# Altium footprint library Inductors SMD.PcbLib: 145 footprints (part 3 of 10)
Each footprint in its own frame and in the unit in brackets; x right, y up, seen from the top. Pads: shape width x height; smd on the part's side, far side on the other; paste and mask are expansions set on the pad; w line width, h text height; cw(c..) or ccw(c..) is an arc to the next point about the centre after c.
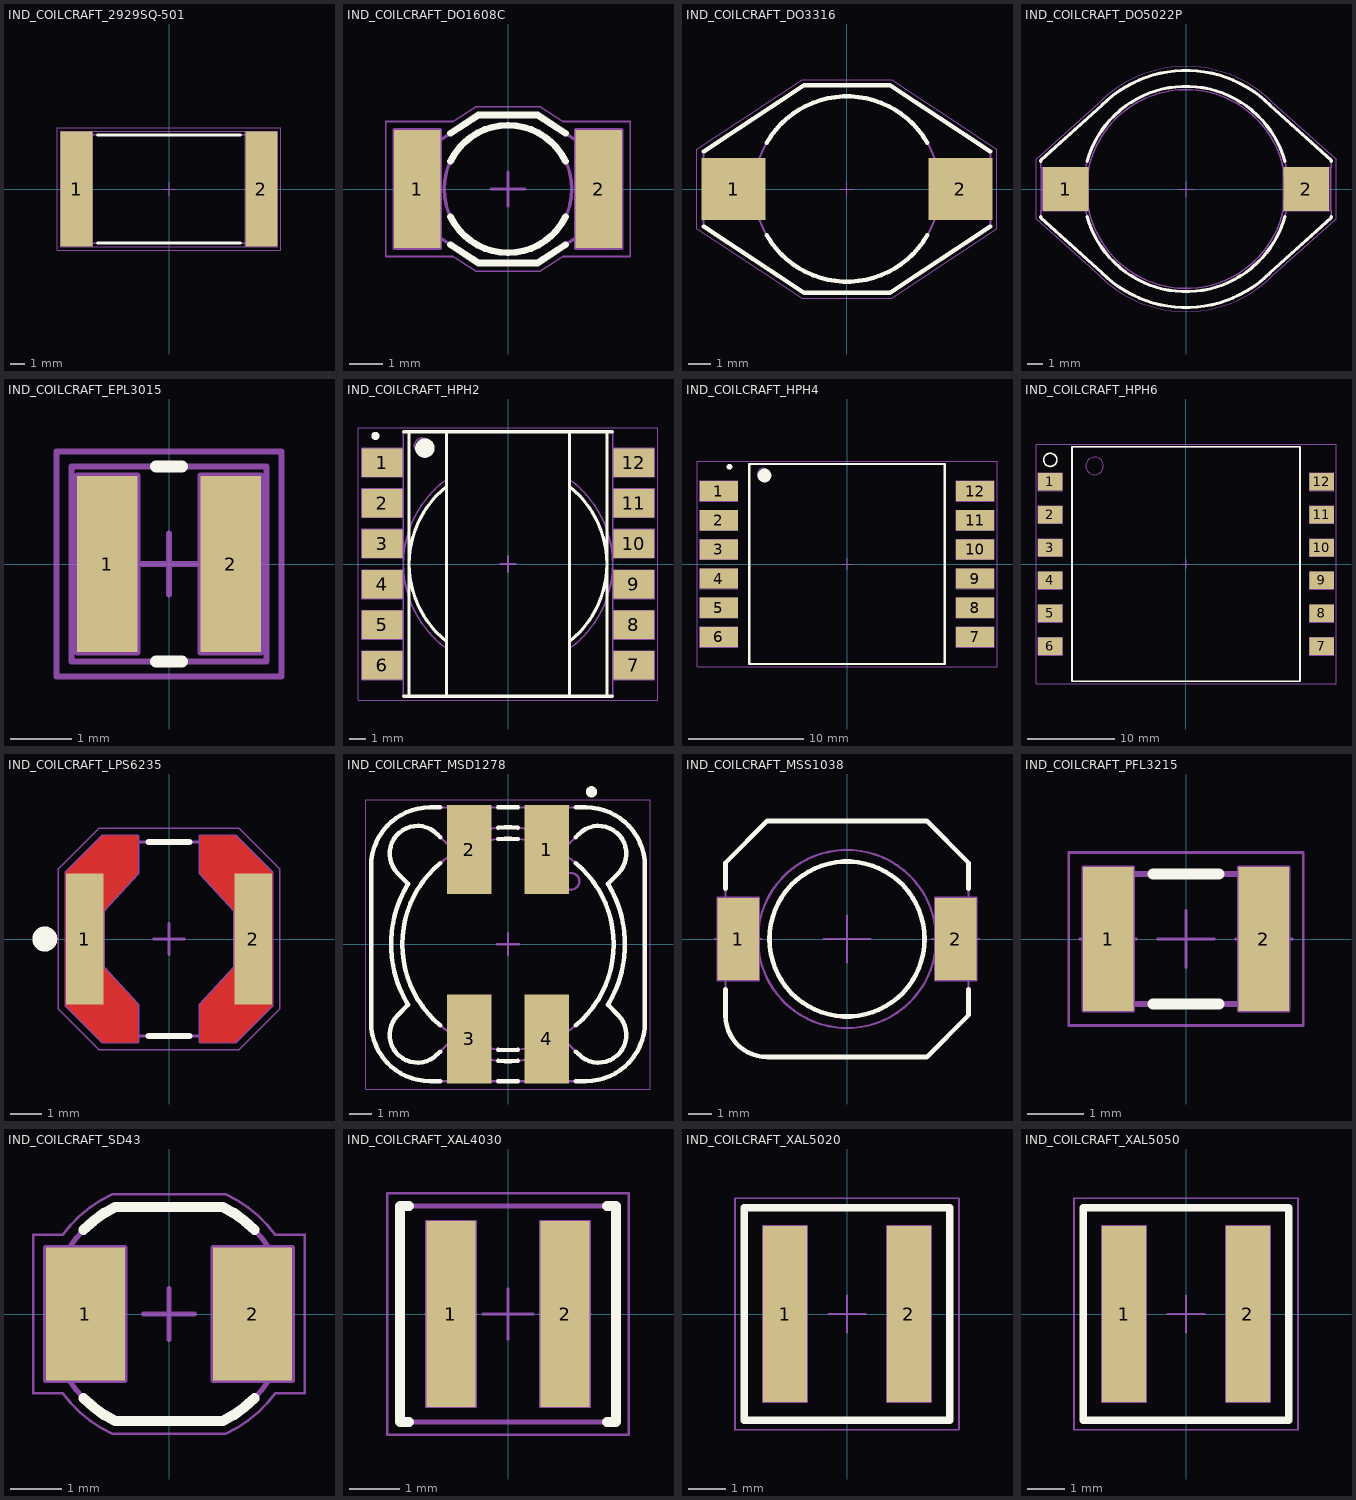
[diagram p2: the footprints below, top view; thin cyan lines are the x and y axes]

## IND_COILCRAFT_2929SQ-501 [mm] "Square Air Core Inductors"
height 7.5
pads (2):
  rect 2.29x8.26 smd: 1(-6.605,0) 2(6.605,0)
Top Overlay:
  lines w0.2: -5.11,-3.875 5.11,-3.875 ; -5.11,3.875 5.11,3.875
Mechanical 8:
  lines w0.05: -5.46,4.13 -5.46,-4.13 -7.75,-4.13 ; -0.5,0 0,0 ; 0,-0.5 0,0 ; 0,0.5 0,0 ; 0.5,0 0,0 ; 5.46,-4.13 5.46,4.13 ; -7.75,-4.13 7.75,-4.13 7.75,4.13 -7.75,4.13 -7.75,-4.13
  lines w0.1: -7.105,0 -6.605,0 ; -6.605,-0.5 -6.605,0 ; -6.605,0.5 -6.605,0 ; -6.105,0 -6.605,0 ; 6.105,0 6.605,0 ; 6.605,-0.5 6.605,0 ; 6.605,0.5 6.605,0 ; 7.105,0 6.605,0
Mechanical 14:
  lines w0.1: -7.19,0 -7.19,3.875 ; -7.19,3.875 -7.19,-3.875 7.19,-3.875 7.19,3.875 -7.19,3.875
Mechanical 15:
  lines w0.05: -8,-4.38 8,-4.38 8,4.38 -8,4.38 -8,-4.38
3D body "IND_COILCRAFT_2929SQ-501.stp": height 7.49, standoff 0, extent -7.19,-3.955 7.14,3.795

## IND_COILCRAFT_DO1608C [mm] "SMD Inductor DO1608C Series, Body Width 4.45mm Body Lenght 6.6mm Height 2.92mm"
height 2.92
pads (2):
  rect 1.4x3.56 smd: 1(-2.73,0) 2(2.73,0)
Top Overlay:
  lines w0.2: -1.73,-1.673 -0.89,-2.225 0.89,-2.225 1.73,-1.673 ; -1.73,-0.833 ccw(c0,0) 1.73,-0.833 ; -1.73,0.833 cw(c0,0) 1.73,0.833 ; -1.73,1.673 -0.89,2.225 0.89,2.225 1.73,1.673
Mechanical 8:
  lines w0.1: -3.23,0 -2.73,0 ; -2.73,-0.5 -2.73,0 ; -2.73,0.5 -2.73,0 ; -2.23,0 -2.73,0 ; -0.5,0 0,0 ; 0,-0.5 0,0 ; 0,0.5 0,0 ; 0.5,0 0,0 ; 2.23,0 2.73,0 ; 2.73,-0.5 2.73,0 ; 2.73,0.5 2.73,0 ; 3.23,0 2.73,0 ; -3.43,-1.78 -2.03,-1.78 -2.03,1.78 -3.43,1.78 -3.43,-1.78 ; 2.03,-1.78 3.43,-1.78 3.43,1.78 2.03,1.78 2.03,-1.78
Mechanical 14:
  circle w0.1: c0,0 r1.92
  lines w0.1: -3.3,-0.64 -0.89,-2.225 0.89,-2.225 3.3,-0.64 3.3,0.64 0.89,2.225 -0.89,2.225 -3.3,0.64 -3.3,-0.64
Mechanical 15:
  lines w0.05: -3.68,-2.03 -1.642,-2.03 -0.965,-2.475 0.965,-2.475 1.642,-2.03 3.68,-2.03 3.68,2.03 1.642,2.03 0.965,2.475 -0.965,2.475 -1.642,2.03 -3.68,2.03 -3.68,-2.03
3D body "IND_COILCRAFT_DO1608C.stp": height 2.93, standoff 0, extent -3.3,-2.225 3.3,2.225

## IND_COILCRAFT_DO3316 [mm] "SMD Inductor Body Width 9.4mm Body Lenght 12.95mm Height 5.21mm"
height 5.21
pads (2):
  rect 2.92x2.79 smd: 1(-5.145,0) 2(5.145,0)
Top Overlay:
  lines w0.2: -6.5,-1.7 -1.95,-4.7 1.95,-4.7 6.5,-1.7 ; -6.5,1.7 -1.95,4.7 1.95,4.7 6.5,1.7 ; -3.637,-2.1 ccw(c0,0) 3.637,-2.1 ; -3.637,2.1 cw(c0,0) 3.637,2.1
Mechanical 14:
  circle w0.1: c0,0 r4.2
  lines w0.1: -6.5,-1.7 -1.95,-4.7 1.95,-4.7 6.5,-1.7 6.5,1.7 1.95,4.7 -1.95,4.7 -6.5,1.7 -6.5,-1.7
Mechanical 15:
  lines w0.05: -0.3,0 0.3,0 ; 0,-0.3 0,0.3 ; -6.8,-1.802 -2.025,-4.95 2.025,-4.95 6.8,-1.802 6.8,1.802 2.025,4.95 -2.025,4.95 -6.8,1.802 -6.8,-1.802
3D body "IND_COILCRAFT_DO3316.stp": height 5.2, standoff 0, extent -6.475,-4.7 6.475,4.7

## IND_COILCRAFT_DO5022P [mm] "SMD Inductor Body Width 15.24mm Body Lenght 18.54mm Height 7.11mm"
height 7.11
pads (2):
  rect 2.92x2.79 smd: 1(-7.685,0) 2(7.685,0)
Top Overlay:
  lines w0.2: -9.271,-1.745 -9.271,-1.828 -5.369,-5.341 ccw(c0,0) 5.369,-5.341 9.271,-1.828 9.271,-1.745 ; -9.271,1.745 -9.271,1.828 -5.369,5.341 cw(c0,0) 5.369,5.341 9.271,1.828 9.271,1.745 ; -6.318,-1.745 ccw(c0,0) 6.318,-1.745 ; -6.318,1.745 cw(c0,0) 6.318,1.745
Mechanical 8:
  lines w0.05: -8.185,0 -7.685,0 ; -7.685,-0.5 -7.685,0 ; -7.685,0.5 -7.685,0 ; -7.185,0 -7.685,0 ; -0.5,0 0,0 ; 0,-0.5 0,0 ; 0,0.5 0,0 ; 0.5,0 0,0 ; 7.185,0 7.685,0 ; 7.685,-0.5 7.685,0 ; 7.685,0.5 7.685,0 ; 8.185,0 7.685,0 ; -9.145,-1.395 -6.225,-1.395 -6.225,1.395 -9.145,1.395 -9.145,-1.395 ; 6.225,-1.395 6.225,1.395 9.145,1.395 9.145,-1.395 6.225,-1.395
Mechanical 14:
  circle w0.1: c0,0 r6.35
  circle w0.1: c0,0 r6.555
  lines w0.1: -9.233,-1.37 -9.233,1.37 ; 9.233,-1.37 9.233,1.37 ; -9.271,-1.828 -5.369,-5.341 ccw(c0,0) 5.369,-5.341 9.271,-1.828 9.271,-1.37 7.112,-1.37 7.112,1.37 9.271,1.37 9.271,1.828 5.369,5.341 ccw(c0,0) -5.369,5.341 -9.271,1.828 -9.271,1.37 -7.112,1.37 -7.112,-1.37 -9.271,-1.37 -9.271,-1.828
Mechanical 15:
  lines w0.05: -9.577,-1.888 -5.547,-5.517 ccw(c0,0) 5.547,-5.517 9.577,-1.888 9.577,1.888 5.547,5.517 ccw(c0,0) -5.547,5.517 -9.577,1.888 -9.577,-1.888
3D body "IND_COILCRAFT_DO5022P.stp": height 7, standoff 0, extent -9.017,-7.366 9.017,7.366

## IND_COILCRAFT_EPL3015 [mm] "SMD Inductor  Body Width 3.2mm Body Lenght 3.2mm Height 1.55mm, EPL3015 Series"
height 1.55
pads (2):
  rect 1x2.9 smd: 1(-1.015,0) 2(1.015,0)
Top Overlay:
  lines w0.2: -0.215,-1.6 0.215,-1.6 ; -0.215,1.6 0.215,1.6
Mechanical 8:
  lines w0.1: -0.5,0 0,0 ; 0,-0.5 0,0 ; 0,0.5 0,0 ; 0.5,0 0,0 ; -0.515,-1.45 -0.515,1.45 ; -0.515,-1.45 -1.515,-1.45 -1.515,1.45 -0.515,1.45 ; -0.515,-1.45 -1.015,0 -0.515,1.45 ; 0.515,-1.45 0.515,1.45 ; 0.515,-1.45 1.515,-1.45 1.515,1.45 0.515,1.45 ; 0.515,-1.45 1.015,0 0.515,1.45
Mechanical 14:
  lines w0.1: -1.6,-1.6 1.6,-1.6 1.6,1.6 -1.6,1.6 -1.6,-1.6
Mechanical 15:
  lines w0.1: -1.85,-1.85 1.85,-1.85 1.85,1.85 -1.85,1.85 -1.85,-1.85
3D body "IND_COILCRAFT_EPL3015.stp": height 1.55, standoff 0, extent -1.598,-1.598 1.598,1.598

## IND_COILCRAFT_HPH2 [mm] "Hexa-Path Magnetics, Six 1:1 Isolated Windings, HPH2 Case"
height 7.4
pads (12):
  rect 2.5x1.75 smd: 1(-7.75,6.25) 2(-7.75,3.75) 3(-7.75,1.25) 4(-7.75,-1.25) 5(-7.75,-3.75) 6(-7.75,-6.25) 7(7.75,-6.25) 8(7.75,-3.75) 9(7.75,-1.25) 10(7.75,1.25) 11(7.75,3.75) 12(7.75,6.25)
Top Overlay:
  circle w0.25: c-8.175,7.9 r0.125
  circle w0.6: c-5.125,7.15 r0.3
  lines w0.2: -6.45,-8.15 6.45,-8.15 ; -6.45,8.15 6.45,8.15 ; -6.1,-8.15 -6.1,8.15 ; -3.8,-8.15 -3.8,8.15 ; -3.8,-4.772 cw(c0,0) -3.8,4.772 ; 3.8,-8.15 3.8,8.15 ; 3.8,-4.772 ccw(c0,0) 3.8,4.772 ; 6.1,-8.15 6.1,8.15
Mechanical 8:
  lines w0.1: -8.25,-6.25 -7.75,-6.25 ; -8.25,-3.75 -7.75,-3.75 ; -8.25,-1.25 -7.75,-1.25 ; -8.25,1.25 -7.75,1.25 ; -8.25,3.75 -7.75,3.75 ; -8.25,6.25 -7.75,6.25 ; -7.75,-6.75 -7.75,-6.25 ; -7.75,-5.75 -7.75,-6.25 ; -7.75,-4.25 -7.75,-3.75 ; -7.75,-3.25 -7.75,-3.75 ; -7.75,-1.75 -7.75,-1.25 ; -7.75,-0.75 -7.75,-1.25 ; -7.75,0.75 -7.75,1.25 ; -7.75,1.75 -7.75,1.25 ; -7.75,3.25 -7.75,3.75 ; -7.75,4.25 -7.75,3.75 ; -7.75,5.75 -7.75,6.25 ; -7.75,6.75 -7.75,6.25 ; -7.25,-6.25 -7.75,-6.25 ; -7.25,-3.75 -7.75,-3.75 ; -7.25,-1.25 -7.75,-1.25 ; -7.25,1.25 -7.75,1.25 ; -7.25,3.75 -7.75,3.75 ; -7.25,6.25 -7.75,6.25 ; -0.5,0 0,0 ; 0,-0.5 0,0 ; 0,0.5 0,0 ; 0.5,0 0,0 ; 7.25,-6.25 7.75,-6.25 ; 7.25,-3.75 7.75,-3.75 ; 7.25,-1.25 7.75,-1.25 ; 7.25,1.25 7.75,1.25 ; 7.25,3.75 7.75,3.75 ; 7.25,6.25 7.75,6.25 ; 7.75,-6.75 7.75,-6.25 ; 7.75,-5.75 7.75,-6.25 ; 7.75,-4.25 7.75,-3.75 ; 7.75,-3.25 7.75,-3.75 ; 7.75,-1.75 7.75,-1.25 ; 7.75,-0.75 7.75,-1.25 ; 7.75,0.75 7.75,1.25 ; 7.75,1.75 7.75,1.25 ; 7.75,3.25 7.75,3.75 ; 7.75,4.25 7.75,3.75 ; 7.75,5.75 7.75,6.25 ; 7.75,6.75 7.75,6.25 ; 8.25,-6.25 7.75,-6.25 ; 8.25,-3.75 7.75,-3.75 ; 8.25,-1.25 7.75,-1.25 ; 8.25,1.25 7.75,1.25 ; 8.25,3.75 7.75,3.75 ; 8.25,6.25 7.75,6.25 ; -9,-7.125 -9,-5.375 -6.5,-5.375 -6.5,-7.125 -9,-7.125 ; -9,-4.625 -9,-2.875 -6.5,-2.875 -6.5,-4.625 -9,-4.625 ; -9,-2.125 -9,-0.375 -6.5,-0.375 -6.5,-2.125 -9,-2.125 ; -9,0.375 -9,2.125 -6.5,2.125 -6.5,0.375 -9,0.375 ; -9,2.875 -9,4.625 -6.5,4.625 -6.5,2.875 -9,2.875 ; -9,5.375 -9,7.125 -6.5,7.125 -6.5,5.375 -9,5.375 ; 6.5,-7.125 6.5,-5.375 9,-5.375 9,-7.125 6.5,-7.125 ; 6.5,-4.625 6.5,-2.875 9,-2.875 9,-4.625 6.5,-4.625 ; 6.5,-2.125 6.5,-0.375 9,-0.375 9,-2.125 6.5,-2.125 ; 6.5,0.375 6.5,2.125 9,2.125 9,0.375 6.5,0.375 ; 6.5,2.875 6.5,4.625 9,4.625 9,2.875 6.5,2.875 ; 6.5,5.375 6.5,7.125 9,7.125 9,5.375 6.5,5.375
Mechanical 14:
  circle w0.1: c-5.275,7.275 r0.5
  lines w0.1: -3.8,-8.15 -3.8,8.15 ; -3.8,-5.212 cw(c0,0) -3.8,5.212 ; 3.8,-8.15 3.8,8.15 ; 3.8,-5.212 ccw(c0,0) 3.8,5.212 ; -6.45,-8.15 6.45,-8.15 6.45,8.15 -6.45,8.15 -6.45,-8.15
Mechanical 15:
  lines w0.05: -9.25,-8.4 9.25,-8.4 9.25,8.4 -9.25,8.4 -9.25,-8.4
3D body "IND_COILCRAFT_HPH2.stp": height 7.4, standoff 0.01, extent -8.4,-8.15 8.4,8.15

## IND_COILCRAFT_HPH4 [mm] "Hexa-Path Magnetics, Two Trifilar Windings, HPH4 Case"
height 9.7
pads (12):
  rect 3.3x1.75 smd: 1(-11.15,6.35) 2(-11.15,3.81) 3(-11.15,1.27) 4(-11.15,-1.27) 5(-11.15,-3.81) 6(-11.15,-6.35) 7(11.15,-6.35) 8(11.15,-3.81) 9(11.15,-1.27) 10(11.15,1.27) 11(11.15,3.81) 12(11.15,6.35)
Top Overlay:
  circle w0.25: c-10.225,8.45 r0.125
  circle w0.6: c-7.175,7.7 r0.3
  lines w0.2: -8.5,-8.7 8.5,-8.7 8.5,8.7 -8.5,8.7 -8.5,-8.7
Mechanical 8:
  lines w0.1: -11.65,-6.35 -11.15,-6.35 ; -11.65,-3.81 -11.15,-3.81 ; -11.65,-1.27 -11.15,-1.27 ; -11.65,1.27 -11.15,1.27 ; -11.65,3.81 -11.15,3.81 ; -11.65,6.35 -11.15,6.35 ; -11.15,-6.85 -11.15,-6.35 ; -11.15,-5.85 -11.15,-6.35 ; -11.15,-4.31 -11.15,-3.81 ; -11.15,-3.31 -11.15,-3.81 ; -11.15,-1.77 -11.15,-1.27 ; -11.15,-0.77 -11.15,-1.27 ; -11.15,0.77 -11.15,1.27 ; -11.15,1.77 -11.15,1.27 ; -11.15,3.31 -11.15,3.81 ; -11.15,4.31 -11.15,3.81 ; -11.15,5.85 -11.15,6.35 ; -11.15,6.85 -11.15,6.35 ; -10.65,-6.35 -11.15,-6.35 ; -10.65,-3.81 -11.15,-3.81 ; -10.65,-1.27 -11.15,-1.27 ; -10.65,1.27 -11.15,1.27 ; -10.65,3.81 -11.15,3.81 ; -10.65,6.35 -11.15,6.35 ; -0.5,0 0,0 ; 0,-0.5 0,0 ; 0,0.5 0,0 ; 0.5,0 0,0 ; 10.65,-6.35 11.15,-6.35 ; 10.65,-3.81 11.15,-3.81 ; 10.65,-1.27 11.15,-1.27 ; 10.65,1.27 11.15,1.27 ; 10.65,3.81 11.15,3.81 ; 10.65,6.35 11.15,6.35 ; 11.15,-6.85 11.15,-6.35 ; 11.15,-5.85 11.15,-6.35 ; 11.15,-4.31 11.15,-3.81 ; 11.15,-3.31 11.15,-3.81 ; 11.15,-1.77 11.15,-1.27 ; 11.15,-0.77 11.15,-1.27 ; 11.15,0.77 11.15,1.27 ; 11.15,1.77 11.15,1.27 ; 11.15,3.31 11.15,3.81 ; 11.15,4.31 11.15,3.81 ; 11.15,5.85 11.15,6.35 ; 11.15,6.85 11.15,6.35 ; 11.65,-6.35 11.15,-6.35 ; 11.65,-3.81 11.15,-3.81 ; 11.65,-1.27 11.15,-1.27 ; 11.65,1.27 11.15,1.27 ; 11.65,3.81 11.15,3.81 ; 11.65,6.35 11.15,6.35 ; -12.8,-7.225 -12.8,-5.475 -9.5,-5.475 -9.5,-7.225 -12.8,-7.225 ; -12.8,-4.685 -12.8,-2.935 -9.5,-2.935 -9.5,-4.685 -12.8,-4.685 ; -12.8,-2.145 -12.8,-0.395 -9.5,-0.395 -9.5,-2.145 -12.8,-2.145 ; -12.8,0.395 -12.8,2.145 -9.5,2.145 -9.5,0.395 -12.8,0.395 ; -12.8,2.935 -12.8,4.685 -9.5,4.685 -9.5,2.935 -12.8,2.935 ; -12.8,5.475 -12.8,7.225 -9.5,7.225 -9.5,5.475 -12.8,5.475 ; 9.5,-7.225 9.5,-5.475 12.8,-5.475 12.8,-7.225 9.5,-7.225 ; 9.5,-4.685 9.5,-2.935 12.8,-2.935 12.8,-4.685 9.5,-4.685 ; 9.5,-2.145 9.5,-0.395 12.8,-0.395 12.8,-2.145 9.5,-2.145 ; 9.5,0.395 9.5,2.145 12.8,2.145 12.8,0.395 9.5,0.395 ; 9.5,2.935 9.5,4.685 12.8,4.685 12.8,2.935 9.5,2.935 ; 9.5,5.475 9.5,7.225 12.8,7.225 12.8,5.475 9.5,5.475
Mechanical 14:
  circle w0.1: c-7.325,7.825 r0.5
  lines w0.1: -8.5,-8.7 8.5,-8.7 8.5,8.7 -8.5,8.7 -8.5,-8.7
Mechanical 15:
  lines w0.05: -13.05,-8.95 13.05,-8.95 13.05,8.95 -13.05,8.95 -13.05,-8.95
3D body "IND_COILCRAFT_HPH4.stp": height 9.7, standoff 0, extent -12.065,-8.7 12.065,8.7

## IND_COILCRAFT_HPH6 [mm] "Hexa-Path Magnetics, Two Trifilar Windings, HPH6 Case"
height 13.6
pads (12):
  rect 2.75x2 smd: 1(-15.475,9.375) 2(-15.475,5.625) 3(-15.475,1.875) 4(-15.475,-1.875) 5(-15.475,-5.625) 6(-15.475,-9.375) 7(15.475,-9.375) 8(15.475,-5.625) 9(15.475,-1.875) 10(15.475,1.875) 11(15.475,5.625) 12(15.475,9.375)
Top Overlay:
  circle w0.2: c-15.475,11.875 r0.75
  lines w0.2: -13,-13.375 13,-13.375 13,13.375 -13,13.375 -13,-13.375
Mechanical 8:
  lines w0.1: -15.975,-9.375 -15.475,-9.375 ; -15.975,-5.625 -15.475,-5.625 ; -15.975,-1.875 -15.475,-1.875 ; -15.975,1.875 -15.475,1.875 ; -15.975,5.625 -15.475,5.625 ; -15.975,9.375 -15.475,9.375 ; -15.475,-9.875 -15.475,-9.375 ; -15.475,-8.875 -15.475,-9.375 ; -15.475,-6.125 -15.475,-5.625 ; -15.475,-5.125 -15.475,-5.625 ; -15.475,-2.375 -15.475,-1.875 ; -15.475,-1.375 -15.475,-1.875 ; -15.475,1.375 -15.475,1.875 ; -15.475,2.375 -15.475,1.875 ; -15.475,5.125 -15.475,5.625 ; -15.475,6.125 -15.475,5.625 ; -15.475,8.875 -15.475,9.375 ; -15.475,9.875 -15.475,9.375 ; -14.975,-9.375 -15.475,-9.375 ; -14.975,-5.625 -15.475,-5.625 ; -14.975,-1.875 -15.475,-1.875 ; -14.975,1.875 -15.475,1.875 ; -14.975,5.625 -15.475,5.625 ; -14.975,9.375 -15.475,9.375 ; -0.5,0 0,0 ; 0,-0.5 0,0 ; 0,0.5 0,0 ; 0.5,0 0,0 ; 14.975,-9.375 15.475,-9.375 ; 14.975,-5.625 15.475,-5.625 ; 14.975,-1.875 15.475,-1.875 ; 14.975,1.875 15.475,1.875 ; 14.975,5.625 15.475,5.625 ; 14.975,9.375 15.475,9.375 ; 15.475,-9.875 15.475,-9.375 ; 15.475,-8.875 15.475,-9.375 ; 15.475,-6.125 15.475,-5.625 ; 15.475,-5.125 15.475,-5.625 ; 15.475,-2.375 15.475,-1.875 ; 15.475,-1.375 15.475,-1.875 ; 15.475,1.375 15.475,1.875 ; 15.475,2.375 15.475,1.875 ; 15.475,5.125 15.475,5.625 ; 15.475,6.125 15.475,5.625 ; 15.475,8.875 15.475,9.375 ; 15.475,9.875 15.475,9.375 ; 15.975,-9.375 15.475,-9.375 ; 15.975,-5.625 15.475,-5.625 ; 15.975,-1.875 15.475,-1.875 ; 15.975,1.875 15.475,1.875 ; 15.975,5.625 15.475,5.625 ; 15.975,9.375 15.475,9.375 ; -16.85,-10.375 -16.85,-8.375 -14.1,-8.375 -14.1,-10.375 -16.85,-10.375 ; -16.85,-6.625 -16.85,-4.625 -14.1,-4.625 -14.1,-6.625 -16.85,-6.625 ; -16.85,-2.875 -16.85,-0.875 -14.1,-0.875 -14.1,-2.875 -16.85,-2.875 ; -16.85,0.875 -16.85,2.875 -14.1,2.875 -14.1,0.875 -16.85,0.875 ; -16.85,4.625 -16.85,6.625 -14.1,6.625 -14.1,4.625 -16.85,4.625 ; -16.85,8.375 -16.85,10.375 -14.1,10.375 -14.1,8.375 -16.85,8.375 ; 14.1,-10.375 14.1,-8.375 16.85,-8.375 16.85,-10.375 14.1,-10.375 ; 14.1,-6.625 14.1,-4.625 16.85,-4.625 16.85,-6.625 14.1,-6.625 ; 14.1,-2.875 14.1,-0.875 16.85,-0.875 16.85,-2.875 14.1,-2.875 ; 14.1,0.875 14.1,2.875 16.85,2.875 16.85,0.875 14.1,0.875 ; 14.1,4.625 14.1,6.625 16.85,6.625 16.85,4.625 14.1,4.625 ; 14.1,8.375 14.1,10.375 16.85,10.375 16.85,8.375 14.1,8.375
Mechanical 14:
  circle w0.1: c-10.409,11.181 r1
  lines w0.1: -13,-13.375 13,-13.375 13,13.375 -13,13.375 -13,-13.375
Mechanical 15:
  lines w0.05: -17.1,-13.625 -17.1,13.625 17.1,13.625 17.1,-13.625 -17.1,-13.625
3D body "IND_COILCRAFT_HPH6.stp": height 13.6, standoff 0, extent -16.325,-13.375 16.325,13.375

## IND_COILCRAFT_LPS6235 [mm] "SMD Inductor LPS6235 Series, Body Width 6mm Body Lenght 6mm Height 3.5mm"
height 3.5
pads (2):
  rect 1.2x4.2 smd paste-0.26 mask-0.26: 1(-2.7,0) 2(2.7,0)
Top Layer:
  region: 1,3.3 1,2.1 2.1,0.9 2.1,-0.9 1,-2.1 1,-3.3 2.125,-3.3 3.3,-2.125 3.3,2.125 2.125,3.3
  region: -3.3,2.125 -2.125,3.3 -1,3.3 -1,2.1 -2.1,0.9 -2.1,-0.9 -1,-2.1 -1,-3.3 -2.125,-3.3 -3.3,-2.125
Top Overlay:
  circle w0.4: c-3.975,0 r0.2
  lines w0.2: -0.65,-3.103 0.65,-3.103 ; -0.65,3.103 0.65,3.103
Mechanical 8:
  lines w0.1: -3.3,0 -2.1,0 ; -3.2,0 -2.7,0 ; -2.7,-0.5 -2.7,0 ; -2.7,0.5 -2.7,0 ; -2.2,0 -2.7,0 ; -0.5,0 0,0 ; 0,-0.5 0,0 ; 0,0.5 0,0 ; 0.5,0 0,0 ; 2.1,0 3.3,0 ; 2.2,0 2.7,0 ; 2.7,-0.5 2.7,0 ; 2.7,0.5 2.7,0 ; 3.2,0 2.7,0 ; -3.3,-2.125 -3.3,2.125 -2.125,3.3 -1,3.3 -1,2.1 -2.1,0.9 -2.1,-0.9 -1,-2.1 -1,-3.3 -2.125,-3.3 -3.3,-2.125 ; 1,-3.3 1,-2.1 2.1,-0.9 2.1,0.9 1,2.1 1,3.3 2.125,3.3 3.3,2.125 3.3,-2.125 2.125,-3.3 1,-3.3
Mechanical 14:
  circle w0.1: c-2.537,0 r0.25
  lines w0.1: -3.103,-2.103 -3.103,2.103 -2.103,3.103 2.103,3.103 3.103,2.103 3.103,-2.103 2.103,-3.103 -2.103,-3.103 -3.103,-2.103
Mechanical 15:
  lines w0.05: -3.55,-2.229 -2.229,-3.55 2.229,-3.55 3.55,-2.229 3.55,2.229 2.229,3.55 -2.229,3.55 -3.55,2.229 -3.55,-2.229
3D body "IND_COILCRAFT_LPS6235.stp": height 3.5, standoff 0, extent -3.103,-3.103 3.103,3.103

## IND_COILCRAFT_MSD1278 [mm] "SMD Inductor  Body Width 12.3mm Body Lenght 12.3mm Height 8.05mm"
height 8.05
pads (4):
  rect 2x4 smd: 1(1.75,4.25) 2(-1.75,4.25) 3(-1.75,-4.25) 4(1.75,-4.25)
Top Overlay:
  circle w0.25: c3.75,6.85 r0.125
  lines w0.2: -3.05,-6.15 -3.5,-6.15 cw(c-3.5,-3.5) -6.15,-3.5 -6.15,3.5 cw(c-3.5,3.5) -3.5,6.15 -3.05,6.15 ; -3.05,-4.818 -3.182,-4.95 cw(c-4.066,-4.066) -4.95,-3.182 -4.489,-2.722 cw(c0,0) -4.489,2.722 -4.95,3.182 cw(c-4.066,4.066) -3.182,4.95 -3.05,4.818 ; -3.05,-3.641 cw(c0,0) -3.05,3.641 ; -0.45,-6.15 0.45,-6.15 ; -0.45,-5.231 ccw(c0,0) 0.45,-5.231 ; -0.45,-4.729 ccw(c0,0) 0.45,-4.729 ; -0.45,4.729 cw(c0,0) 0.45,4.729 ; -0.45,5.231 cw(c0,0) 0.45,5.231 ; -0.45,6.15 0.45,6.15 ; 3.05,-6.15 3.5,-6.15 ccw(c3.5,-3.5) 6.15,-3.5 6.15,3.5 ccw(c3.5,3.5) 3.5,6.15 3.05,6.15 ; 3.05,-4.818 3.182,-4.95 ccw(c4.066,-4.066) 4.95,-3.182 4.489,-2.722 ccw(c0,0) 4.489,2.722 4.95,3.182 ccw(c4.066,4.066) 3.182,4.95 3.05,4.818 ; 3.05,-3.641 ccw(c0,0) 3.05,3.641
Mechanical 8:
  lines w0.1: -2.25,-4.25 -1.75,-4.25 ; -2.25,4.25 -1.75,4.25 ; -1.75,-4.75 -1.75,-4.25 ; -1.75,-3.75 -1.75,-4.25 ; -1.75,3.75 -1.75,4.25 ; -1.75,4.75 -1.75,4.25 ; -1.25,-4.25 -1.75,-4.25 ; -1.25,4.25 -1.75,4.25 ; -0.5,0 0,0 ; 0,-0.5 0,0 ; 0,0.5 0,0 ; 0.5,0 0,0 ; 1.25,-4.25 1.75,-4.25 ; 1.25,4.25 1.75,4.25 ; 1.75,-4.75 1.75,-4.25 ; 1.75,-3.75 1.75,-4.25 ; 1.75,3.75 1.75,4.25 ; 1.75,4.75 1.75,4.25 ; 2.25,-4.25 1.75,-4.25 ; 2.25,4.25 1.75,4.25
Mechanical 14:
  circle w0.1: c0,0 r4.75
  circle w0.1: c2.828,2.828 r0.375
  lines w0.1: -6.15,-3.5 ccw(c-3.5,-3.5) -3.5,-6.15 3.5,-6.15 ccw(c3.5,-3.5) 6.15,-3.5 6.15,3.5 ccw(c3.5,3.5) 3.5,6.15 -3.5,6.15 ccw(c-3.5,3.5) -6.15,3.5 -6.15,-3.5 ; -4.95,-3.182 ccw(c-4.066,-4.066) -3.182,-4.95 -2.722,-4.489 ccw(c0,0) 2.722,-4.489 3.182,-4.95 ccw(c4.066,-4.066) 4.95,-3.182 4.489,-2.722 ccw(c0,0) 4.489,2.722 4.95,3.182 ccw(c4.066,4.066) 3.182,4.95 2.722,4.489 ccw(c0,0) -2.722,4.489 -3.182,4.95 ccw(c-4.066,4.066) -4.95,3.182 -4.489,2.722 ccw(c0,0) -4.489,-2.722 -4.95,-3.182
Mechanical 15:
  lines w0.05: -6.4,-6.5 6.4,-6.5 6.4,6.5 -6.4,6.5 -6.4,-6.5
3D body "IND_COILCRAFT_MSD1278.stp": height 8.05, standoff 0, extent -6.15,-6.15 6.15,6.15

## IND_COILCRAFT_MSS1038 [mm] "SMD Inductor  Body Width 10mm Body Lenght 10.2mm Height 4mm"
height 4
pads (2):
  rect 1.78x3.56 smd: 1(-4.7,0) 2(4.7,0)
Top Overlay:
  circle w0.2: c0,0 r3.35
  lines w0.2: -5.25,-2.18 -5.25,-3.3 ccw(c-3.45,-3.3) -3.45,-5.1 3.45,-5.1 5.25,-3.3 5.25,-2.18 ; -5.25,2.18 -5.25,3.3 -3.45,5.1 3.45,5.1 5.25,3.3 5.25,2.18
Mechanical 8:
  lines w0.1: -5.7,0 -4.7,0 ; -4.7,-1 -4.7,0 ; -4.7,1 -4.7,0 ; -3.7,0 -4.7,0 ; -1,0 0,0 ; 0,-1 0,0 ; 0,1 0,0 ; 1,0 0,0 ; 3.7,0 4.7,0 ; 4.7,-1 4.7,0 ; 4.7,1 4.7,0 ; 5.7,0 4.7,0 ; -5.59,-1.78 -3.81,-1.78 -3.81,1.78 -5.59,1.78 -5.59,-1.78 ; 3.81,-1.78 5.59,-1.78 5.59,1.78 3.81,1.78 3.81,-1.78
Mechanical 14:
  circle w0.1: c0,0 r3.85
  circle w0.1: c0,0 r3.35
  lines w0.1: -5.25,-1.6 -5.25,1.6 ; -5.25,-1.6 -5.25,-3.3 ccw(c-3.45,-3.3) -3.45,-5.1 3.45,-5.1 5.25,-3.3 5.25,-1.6 ; -5.25,-1.6 -3.85,-1.6 -3.85,1.6 -5.25,1.6 ; -5.25,1.6 -5.25,3.3 -3.45,5.1 3.45,5.1 5.25,3.3 5.25,1.6 ; 5.25,-1.6 5.25,1.6 ; 5.25,-1.6 3.85,-1.6 3.85,1.6 5.25,1.6
3D body "IND_COILCRAFT_MSS1038.stp": height 4, standoff 0, extent -5.25,-5.1 5.25,5.1

## IND_COILCRAFT_PFL3215 [mm] "SMD Inductor Body Width 2.29mm Body Lenght 3.2mm Height 1.5mm, PFL3215 Series"
height 1.5
pads (2):
  rect 0.89x2.54 smd: 1(-1.37,0) 2(1.37,0)
Top Overlay:
  lines w0.2: -0.575,-1.145 0.575,-1.145 ; -0.575,1.145 0.575,1.145
Mechanical 8:
  lines w0.05: -1.87,0 -1.37,0 ; -1.37,-0.5 -1.37,0 ; -1.37,0.5 -1.37,0 ; -1.37,1.27 -1.815,1.27 ; -0.87,0 -1.37,0 ; -0.5,0 0,0 ; 0,-0.5 0,0 ; 0,0.5 0,0 ; 0.5,0 0,0 ; 0.87,0 1.37,0 ; 1.37,-0.5 1.37,0 ; 1.37,0.5 1.37,0 ; 1.37,1.27 1.815,1.27 ; 1.87,0 1.37,0 ; -1.815,1.27 -1.815,-1.27 -0.925,-1.27 -0.925,1.27 -1.815,1.27 ; 1.815,1.27 1.815,-1.27 0.925,-1.27 0.925,1.27 1.815,1.27
Mechanical 14:
  lines w0.1: -1.6,-1.145 -1.6,1.145 1.6,1.145 1.6,-1.145 -1.6,-1.145
Mechanical 15:
  lines w0.05: -2.065,-1.52 -2.065,1.52 2.065,1.52 2.065,-1.52 -2.065,-1.52
3D body "IND_COILCRAFT_PFL3215.stp": height 1.5, standoff 0, extent -1.6,-1.143 1.6,1.143

## IND_COILCRAFT_SD43 [mm] "SMD Inductor  Body Width 4.2mm Body Lenght 4.7mm Height 3.45mm"
height 3.45
pads (2):
  rect 1.55x2.6 smd: 1(-1.64,0) 2(1.64,0)
Top Overlay:
  lines w0.2: -1.673,-1.65 ccw(c0,0) -1.055,-2.1 1.055,-2.1 ccw(c0,0) 1.673,-1.65 ; -1.673,1.65 cw(c0,0) -1.055,2.1 1.055,2.1 cw(c0,0) 1.673,1.65
Mechanical 8:
  lines w0.1: -2.14,0 -1.64,0 ; -1.64,-0.5 -1.64,0 ; -1.64,0.5 -1.64,0 ; -1.14,0 -1.64,0 ; -0.5,0 0,0 ; 0,-0.5 0,0 ; 0,0.5 0,0 ; 0.5,0 0,0 ; 1.14,0 1.64,0 ; 1.64,-0.5 1.64,0 ; 1.64,0.5 1.64,0 ; 2.14,0 1.64,0 ; -2.415,-1.3 -2.415,1.3 -0.865,1.3 -0.865,-1.3 -2.415,-1.3 ; 0.865,-1.3 0.865,1.3 2.415,1.3 2.415,-1.3 0.865,-1.3
Mechanical 14:
  lines w0.1: -2.312,-0.42 ccw(c0,0) -1.055,-2.1 1.055,-2.1 ccw(c0,0) 2.312,-0.42 ccw(c2.115,-0.384) 2.22,-0.213 cw(c2.35,0) 2.22,0.213 ccw(c2.115,0.384) 2.312,0.42 ccw(c0,0) 1.055,2.1 -1.055,2.1 ccw(c0,0) -2.312,0.42 ccw(c-2.115,0.384) -2.22,0.213 cw(c-2.35,0) -2.22,-0.213 ccw(c-2.115,-0.384) -2.312,-0.42
Mechanical 15:
  lines w0.05: -2.665,-1.55 -2.665,1.55 -2.087,1.55 cw(c0,0) -1.112,2.35 1.112,2.35 cw(c0,0) 2.087,1.55 2.665,1.55 2.665,-1.55 2.087,-1.55 cw(c0,0) 1.112,-2.35 -1.112,-2.35 cw(c0,0) -2.087,-1.55 -2.665,-1.55
3D body "IND_COILCRAFT_SD43.stp": height 3.45, standoff 0, extent -2.349,-2.1 2.349,2.1

## IND_COILCRAFT_XAL4030 [mm] "SMD Inductor Body Width 4.3mm Body Lenght 4.3mm Height 3.1mm, XAL4030 Series"
height 3.1
pads (2):
  rect 0.98x3.7 smd: 1(-1.135,0) 2(1.135,0)
Top Overlay:
  lines w0.2: -1.975,-2.15 -2.15,-2.15 -2.15,2.15 -1.975,2.15 ; 1.975,-2.15 2.15,-2.15 2.15,2.15 1.975,2.15
Mechanical 8:
  lines w0.05: -1.635,0 -1.135,0 ; -1.135,-0.5 -1.135,0 ; -1.135,0.5 -1.135,0 ; -0.635,0 -1.135,0 ; -0.5,0 0,0 ; 0,-0.5 0,0 ; 0,0.5 0,0 ; 0.5,0 0,0 ; 0.635,0 1.135,0 ; 1.135,-0.5 1.135,0 ; 1.135,0.5 1.135,0 ; 1.635,0 1.135,0 ; -1.625,-1.85 -1.625,1.85 -0.645,1.85 -0.645,-1.85 -1.625,-1.85 ; 0.645,-1.85 1.625,-1.85 1.625,1.85 0.645,1.85 0.645,-1.85
Mechanical 14:
  lines w0.1: -2.15,-2.15 -2.15,2.15 2.15,2.15 2.15,-2.15 -2.15,-2.15
Mechanical 15:
  lines w0.05: -2.4,-2.4 2.4,-2.4 2.4,2.4 -2.4,2.4 -2.4,-2.4
3D body "IND_COILCRAFT_XAL4030.stp": height 3.1, standoff 0, extent -2.15,-2.15 2.15,2.15

## IND_COILCRAFT_XAL5020 [mm] "SMD Inductor Body Width 5.48mm Body Lenght 5.68mm Height 2mm, XAL5020 Series"
height 3.1
pads (2):
  rect 1.18x4.7 smd: 1(-1.655,0) 2(1.655,0)
Top Overlay:
  lines w0.2: -2.74,-2.84 2.74,-2.84 2.74,2.84 -2.74,2.84 -2.74,-2.84
Mechanical 8:
  lines w0.05: -2.155,0 -1.655,0 ; -1.655,-0.5 -1.655,0 ; -1.655,0.5 -1.655,0 ; -1.155,0 -1.655,0 ; -0.5,0 0,0 ; 0,-0.5 0,0 ; 0,0.5 0,0 ; 0.5,0 0,0 ; 1.155,0 1.655,0 ; 1.655,-0.5 1.655,0 ; 1.655,0.5 1.655,0 ; 2.155,0 1.655,0 ; -2.245,-2.35 -2.245,2.35 -1.065,2.35 -1.065,-2.35 -2.245,-2.35 ; 1.065,-2.35 2.245,-2.35 2.245,2.35 1.065,2.35 1.065,-2.35
Mechanical 14:
  lines w0.1: -2.74,-2.84 2.74,-2.84 2.74,2.84 -2.74,2.84 -2.74,-2.84
Mechanical 15:
  lines w0.05: -2.99,-3.09 2.99,-3.09 2.99,3.09 -2.99,3.09 -2.99,-3.09
3D body "IND_COILCRAFT_XAL5020.stp": height 2, standoff 0, extent -2.74,-2.84 2.74,2.84

## IND_COILCRAFT_XAL5050 [mm] "SMD Inductor Body Width 5.48mm Body Lenght 5.68mm Height 5.21mm, XAL50xx Series"
height 5.21
pads (2):
  rect 1.18x4.7 smd: 1(-1.655,0) 2(1.655,0)
Top Overlay:
  lines w0.2: -2.74,-2.84 -2.74,2.84 2.74,2.84 2.74,-2.84 -2.74,-2.84
Mechanical 8:
  lines w0.05: -2.155,0 -1.655,0 ; -1.655,-0.5 -1.655,0 ; -1.655,0.5 -1.655,0 ; -1.155,0 -1.655,0 ; -0.5,0 0,0 ; 0,-0.5 0,0 ; 0,0.5 0,0 ; 0.5,0 0,0 ; 1.155,0 1.655,0 ; 1.655,-0.5 1.655,0 ; 1.655,0.5 1.655,0 ; 2.155,0 1.655,0 ; -2.245,-2.35 -1.065,-2.35 -1.065,2.35 -2.245,2.35 -2.245,-2.35 ; 1.065,-2.35 1.065,2.35 2.245,2.35 2.245,-2.35 1.065,-2.35
Mechanical 14:
  lines w0.1: -2.74,-2.84 -2.74,2.84 2.74,2.84 2.74,-2.84 -2.74,-2.84
Mechanical 15:
  lines w0.05: -2.99,-3.09 -2.99,3.09 2.99,3.09 2.99,-3.09 -2.99,-3.09
3D body "IND_COILCRAFT_XAL5050.stp": height 5.22, standoff 0, extent -2.74,-2.84 2.74,2.84